# Altium footprint library Design III PCB Library.PcbLib: 98 footprints (part 2 of 7)
Each footprint in its own frame and in the unit in brackets; x right, y up, seen from the top. Pads: shape width x height; smd on the part's side, far side on the other; paste and mask are expansions set on the pad; w line width, h text height; cw(c..) or ccw(c..) is an arc to the next point about the centre after c.
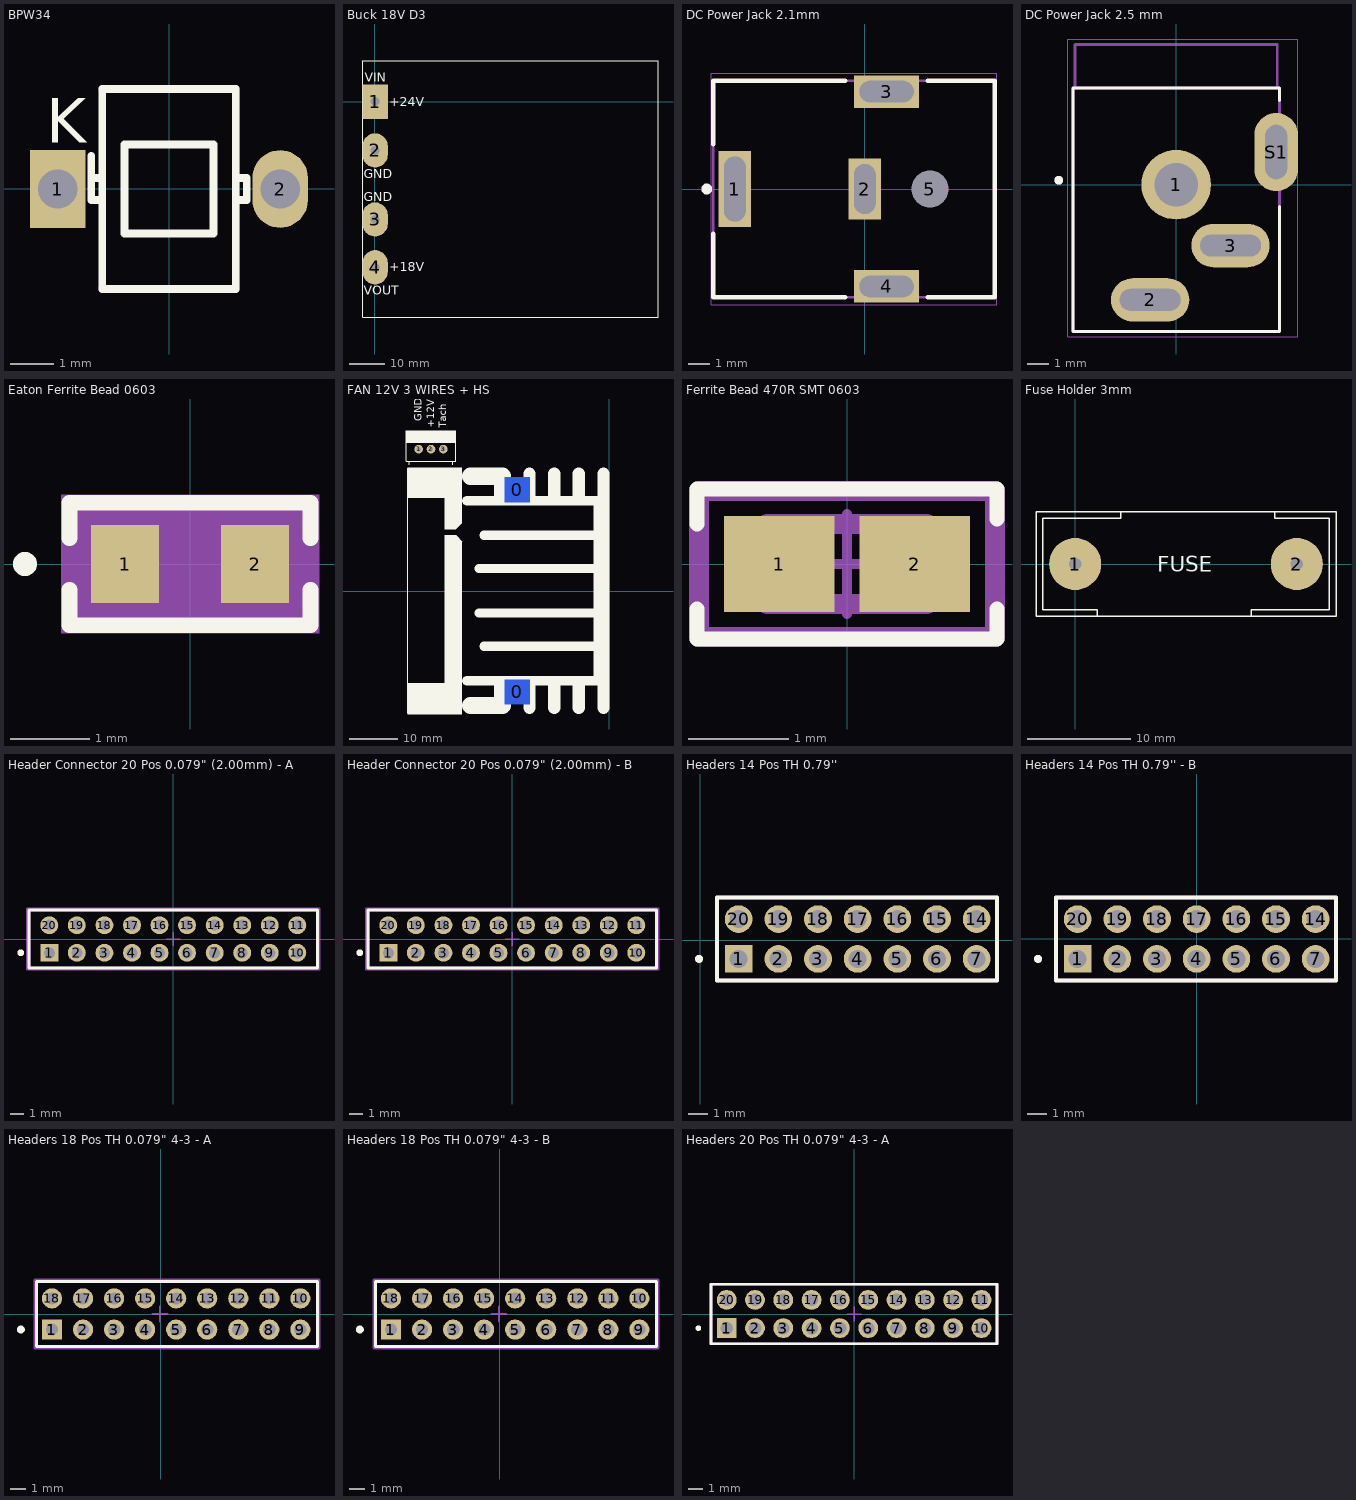
[diagram p1: the footprints below, top view; thin cyan lines are the x and y axes]

## BPW34 [mil] "Photodiode 850nm 20ns 120° 2-DIP (0.213\", 5.40mm)"
pads (2):
  rect 50x70 hole 35.4: 1(-100,-0.21)
  oval 50x70 hole 35.4: 2(100,-0.21)
Top Overlay:
  lines w7: -70,9.79 -60,9.79 ; -70,29.79 -70,-10.21 -60,-10.21 ; 60,-10.21 70,-10.21 70,9.79 60,9.79 ; -60,-90.21 -60,89.79 60,89.79 60,-90.21 -60,-90.21 ; -40,-40.21 -40,-0.21 -40,39.79 40,39.79 40,-40.21 -40,-40.21
  text "K" at -110.36,41.38 h40
Top Assembly:
  lines w7: -60,-90.21 60,-90.21 60,89.79 -60,89.79
3D body: height 70, standoff 10, extent -60,-90.21 60,89.79
3D body: height 77, standoff 75, extent -40,-40.21 40,39.79

## BPW34 - B [mm] "Photodiode 850nm 20ns 120° 2-DIP (0.213\", 5.40mm)"

## Buck 18V D3 [mil] "Buck 18V D3"
pads (4):
  rect 280x380 hole 100: 1(1.66,0.26)
  oval 280x380 hole 100: 2(1.66,-539.74) 3(1.66,-1304.74) 4(1.66,-1834.74)
Top Overlay:
  lines w5: -138.34,-2389.74 -138.34,455.26 3136.66,455.26 3136.66,-2389.74 -138.34,-2389.74
  text "GND" at -123.34,-849.74 h100
  text "GND" at -123.34,-1104.74 h100
  text "VOUT" at -123.34,-2139.74 h100
  text "+18V" at 156.66,-1879.74 h100
  text "+24V" at 156.66,-49.74 h100
  text "VIN" at -113.34,220.26 h100
3D body: height 191, standoff 190, extent -128.34,-1109.74 -53.34,-999.74
3D body: height 191, standoff 190, extent 71.66,-1109.74 146.66,-999.74
3D body: height 191, standoff 190, extent -28.34,-1109.74 46.66,-999.74
3D body: height 192, standoff 190, extent 346.66,-344.73 1191.66,-324.74
3D body: height 192, standoff 190, extent 346.66,-214.73 1191.66,-194.74
3D body: height 269, standoff 190, extent 351.66,-219.73 451.66,-209.73
3D body: height 269, standoff 190, extent 456.66,-219.73 556.66,-209.73
3D body: height 269, standoff 190, extent 561.66,-219.73 661.66,-209.73
3D body: height 269, standoff 190, extent 666.66,-219.73 766.66,-209.73
3D body: height 269, standoff 190, extent 771.66,-219.73 871.66,-209.73
3D body: height 269, standoff 190, extent 876.66,-219.73 976.66,-209.73
3D body: height 269, standoff 190, extent 981.66,-219.73 1081.66,-209.73
3D body: height 269, standoff 190, extent 1086.66,-219.74 1186.66,-209.74
3D body: height 520, standoff 190, extent 561.66,-759.74 686.66,-344.74
3D body: height 520, standoff 190, extent 561.66,-189.74 686.66,225.26
3D body: height 192, standoff 190, extent 836.77,35.29 1036.66,235.24
3D body: height 192, standoff 190, extent 836.77,-89.71 1036.66,110.24
3D body: height 192, standoff 190, extent 836.77,-214.71 1036.66,-14.77
3D body: height 192, standoff 190, extent 1111.77,-239.7 1311.66,-39.76
3D body: height 192, standoff 190, extent 1111.77,-489.71 1311.66,-289.76
3D body: height 192, standoff 190, extent 836.77,-774.71 1036.66,-574.77
3D body: height 192, standoff 190, extent 836.77,-649.71 1036.66,-449.76
3D body: height 192, standoff 190, extent 836.77,-524.71 1036.66,-324.76
3D body: height 192, standoff 190, extent 1256.71,-1404.72 1356.66,-1304.75
3D body: height 192, standoff 190, extent 1256.72,-1828.72 1356.66,-1728.75
3D body: height 200, standoff 190, extent 1186.65,-1429.74 1361.66,-1399.74
3D body: height 200, standoff 190, extent 1366.65,-1429.74 1541.66,-1399.74
3D body: height 200, standoff 190, extent 1186.65,-1749.74 1361.66,-1719.74
3D body: height 200, standoff 190, extent 1366.65,-1749.74 1541.66,-1719.74
3D body: height 200, standoff 190, extent 2601.65,-1039.74 2801.65,-1009.74
3D body: height 200, standoff 190, extent 2611.65,-539.74 2811.65,-509.74
3D body: height 225, standoff 190, extent 1626.65,-1109.74 1636.65,-1059.75
3D body: height 225, standoff 190, extent 1566.65,-1109.74 1576.65,-1059.75
3D body: height 225, standoff 190, extent 1576.65,-1109.74 1626.65,-1059.75
3D body: height 225, standoff 190, extent 1626.65,-1019.74 1636.65,-969.75
3D body: height 225, standoff 190, extent 1566.65,-1019.74 1576.65,-969.75
3D body: height 225, standoff 190, extent 1576.65,-1019.74 1626.65,-969.75
3D body: height 225, standoff 190, extent 1981.65,-1359.74 1991.65,-1309.75
3D body: height 225, standoff 190, extent 1921.65,-1359.74 1931.65,-1309.75
3D body: height 225, standoff 190, extent 1931.65,-1359.74 1981.65,-1309.75
3D body: height 225, standoff 190, extent 1981.65,-1294.74 1991.65,-1244.75
3D body: height 225, standoff 190, extent 1921.65,-1294.74 1931.65,-1244.75
3D body: height 225, standoff 190, extent 1931.65,-1294.74 1981.65,-1244.75
3D body: height 225, standoff 190, extent 1981.65,-1159.74 1991.65,-1109.75
3D body: height 225, standoff 190, extent 1921.65,-1159.74 1931.65,-1109.75
3D body: height 225, standoff 190, extent 1931.65,-1159.74 1981.65,-1109.75
3D body: height 225, standoff 190, extent 1701.65,-1194.74 1751.65,-1184.74
3D body: height 225, standoff 190, extent 1701.65,-1134.73 1751.65,-1124.73
3D body: height 225, standoff 190, extent 1701.65,-1184.74 1751.65,-1134.73
3D body: height 225, standoff 190, extent 1926.65,-814.74 1976.65,-804.74
3D body: height 225, standoff 190, extent 1926.65,-754.73 1976.65,-744.73
3D body: height 225, standoff 190, extent 1926.65,-804.74 1976.65,-754.73
3D body: height 225, standoff 190, extent 1751.66,-769.73 1761.66,-719.74
3D body: height 225, standoff 190, extent 1811.66,-769.73 1821.66,-719.74
3D body: height 225, standoff 190, extent 1761.66,-769.73 1811.66,-719.74
3D body: height 200, standoff 190, extent 1716.66,-844.74 1726.66,-814.73
3D body: height 200, standoff 190, extent 1736.66,-844.74 1746.66,-814.73
3D body: height 200, standoff 190, extent 1756.66,-844.74 1766.66,-814.73
3D body: height 200, standoff 190, extent 1776.66,-844.74 1786.66,-814.73
3D body: height 200, standoff 190, extent 1796.66,-844.74 1806.66,-814.73
3D body: height 200, standoff 190, extent 1816.66,-844.74 1826.66,-814.73
3D body: height 200, standoff 190, extent 1836.66,-844.74 1846.66,-814.73
3D body: height 200, standoff 190, extent 1856.66,-844.74 1866.66,-814.73
3D body: height 200, standoff 190, extent 1876.66,-844.74 1886.66,-814.73
3D body: height 200, standoff 190, extent 1896.66,-844.74 1906.66,-814.73
3D body: height 200, standoff 190, extent 1896.66,-1064.74 1906.66,-1034.73
3D body: height 200, standoff 190, extent 1876.66,-1064.74 1886.66,-1034.73
3D body: height 200, standoff 190, extent 1856.66,-1064.74 1866.66,-1034.73
3D body: height 200, standoff 190, extent 1836.66,-1064.74 1846.66,-1034.73
3D body: height 200, standoff 190, extent 1816.66,-1064.74 1826.66,-1034.73
3D body: height 200, standoff 190, extent 1796.66,-1064.74 1806.66,-1034.73
3D body: height 200, standoff 190, extent 1776.66,-1064.74 1786.66,-1034.73
3D body: height 200, standoff 190, extent 1756.66,-1064.74 1766.66,-1034.73
3D body: height 200, standoff 190, extent 1736.66,-1064.74 1746.66,-1034.73
3D body: height 200, standoff 190, extent 1716.66,-1064.74 1726.66,-1034.73
3D body: height 191, standoff 190, extent 1765.42,-647.24 1847.91,-572.24
3D body: height 191, standoff 190, extent 1765.42,-437.24 1847.91,-362.24
3D body: height 191, standoff 190, extent 1955.41,-272.24 2037.91,-197.24
3D body: height 191, standoff 190, extent 1955.41,-62.24 2037.91,12.76
3D body: height 191, standoff 190, extent 2235.41,-1412.24 2317.91,-1337.24
3D body: height 191, standoff 190, extent 2235.41,-1062.24 2317.91,-987.24
3D body: height 191, standoff 190, extent 2235.41,-1287.24 2317.91,-1212.24
3D body: height 191, standoff 190, extent 2235.41,-1187.24 2317.91,-1112.24
3D body: height 191, standoff 190, extent 2110.41,-1237.24 2192.91,-1162.24
3D body: height 191, standoff 190, extent 2010.41,-1237.24 2092.91,-1162.24
3D body: height 191, standoff 190, extent 1560.41,-937.24 1642.91,-862.24
3D body: height 191, standoff 190, extent 1560.41,-812.24 1642.91,-737.24
3D body "Led 3mm vert.STEP": height 340.51, standoff 214, extent 1007.59,-1429.59 1301.66,-1299.74
3D body "RESISTOR 0.25W 0.4.STEP": height 405.5, standoff 190, extent 1261.15,-1778.74 1352.16,-1354.74
3D body: height 352, standoff 350, extent 1866.75,-344.71 2016.66,-194.76
3D body: height 200, standoff 190, extent 1806.66,-414.74 1846.66,-384.74
3D body: height 200, standoff 190, extent 1806.66,-624.74 1846.66,-594.74
3D body: height 200, standoff 190, extent 1956.66,-249.74 1996.66,-219.74
3D body: height 200, standoff 190, extent 1956.66,-39.74 1996.66,-9.74
3D body: height 200, standoff 190, extent 2146.65,-604.74 2176.66,-404.74
3D body: height 200, standoff 190, extent 1626.65,-229.74 1656.66,-29.74
3D body: height 140, standoff 133, extent -3.34,-1889.74 86.66,-1799.74
3D body: height 135, standoff 65, extent -48.24,-1934.71 131.66,-1754.76
3D body: height 140, standoff 133, extent -43.34,-1349.74 46.66,-1259.74
3D body: height 135, standoff 65, extent -88.24,-1394.71 91.66,-1214.76
3D body: height 62, standoff 0, extent -98.34,-1404.74 101.66,-1204.74
3D body: height 220, standoff -180, extent -40.34,-1346.74 43.66,-1262.74
3D body: height 140, standoff 133, extent -3.34,-594.74 86.66,-504.74
3D body: height 135, standoff 65, extent -48.24,-639.71 131.66,-459.76
3D body: height 62, standoff 0, extent -98.34,-99.74 101.66,100.26
3D body: height 222, standoff -178, extent -40.34,-41.73 43.66,42.27
3D body: height 62, standoff 0, extent -98.34,-99.74 101.66,100.26
3D body: height 125, standoff 63, extent -98.34,-99.74 101.66,100.26
3D body: height 130, standoff 30, extent 2761.66,-2364.74 3111.66,-2014.74
3D body: height 130, standoff 30, extent 2761.66,85.26 3111.66,435.26
3D body: height 410, standoff 360, extent 1186.65,-164.74 1361.66,-114.74
3D body: height 360, standoff 190, extent 1186.66,-164.74 1236.66,-114.74
3D body: height 410, standoff 360, extent 211.66,-449.74 961.66,-399.74
3D body: height 410, standoff 360, extent 211.66,-699.74 961.66,-649.74
3D body: height 315, standoff 190, extent 261.66,-699.74 436.66,-399.74
3D body: height 245, standoff 190, extent 436.66,-699.74 561.66,-399.74
3D body: height 245, standoff 190, extent 436.66,-139.74 561.66,160.26
3D body: height 360, standoff 190, extent 911.66,110.26 961.66,160.26
3D body: height 410, standoff 360, extent 211.66,-139.74 961.66,-89.74
3D body: height 410, standoff 360, extent 211.66,110.26 961.66,160.26
3D body: height 410, standoff 360, extent 211.66,-14.74 961.66,35.26
3D body: height 315, standoff 175, extent 261.66,-139.74 436.66,160.26
3D body: height 525, standoff 520, extent 561.66,-764.74 686.66,-344.74
3D body: height 525, standoff 520, extent 561.66,-189.74 686.66,225.26
3D body: height 350, standoff 295, extent 1761.66,-464.74 2061.66,-64.74
3D body: height 475, standoff 295, extent 1361.66,-464.74 1761.66,-64.74
3D body: height 290, standoff 190, extent 1846.66,-654.74 2146.66,-354.74
3D body: height 290, standoff 190, extent 1656.66,-279.74 1956.66,20.26
3D body: height 215, standoff 190, extent 1711.66,-1039.74 1911.66,-839.74
3D body: height 310, standoff 190, extent 1186.66,-1719.74 1361.66,-1429.74
3D body: height 311, standoff 309, extent 1186.66,-1664.74 1361.66,-1634.74
3D body: height 310, standoff 190, extent 1366.66,-1719.74 1541.66,-1429.74
3D body: height 311, standoff 309, extent 1366.66,-1664.74 1541.66,-1634.74
3D body: height 509, standoff 504, extent 2518.87,-962.68 2894.66,-586.79
3D body: height 505, standoff 190, extent 2471.66,-1009.74 2941.66,-539.74
3D body: height 185, standoff 130, extent -138.34,-2389.74 3136.66,455.26
3D body: height 260, standoff 190, extent -88.23,-89.71 91.67,90.24
3D body: height 265, standoff 258, extent -43.34,-44.74 46.66,45.26
3D body: height 269, standoff 190, extent 1086.66,-329.74 1186.66,-319.74
3D body: height 269, standoff 190, extent 1086.66,-319.74 1186.66,-219.74
3D body: height 186, standoff 185, extent -138.34,-234.74 1541.66,235.26
3D body: height 186, standoff 185, extent -138.34,-774.74 1541.66,-304.74
3D body: height 186, standoff 185, extent -138.34,-1539.74 1541.66,-1069.74
3D body: height 186, standoff 185, extent -138.34,-2069.74 1541.66,-1599.74
3D body: height 186, standoff 185, extent 2346.66,-2164.74 3061.66,-809.74
3D body: height 186, standoff 185, extent 2346.66,-729.74 3061.66,-329.74
3D body: height 191, standoff 190, extent -118.34,215.26 -38.34,325.26
3D body: height 191, standoff 190, extent -18.34,215.26 26.66,325.26
3D body: height 191, standoff 190, extent 66.66,215.26 141.66,325.26
3D body: height 191, standoff 190, extent -128.34,-2144.74 -48.34,-2034.74
3D body: height 191, standoff 190, extent -28.34,-2144.74 46.66,-2034.74
3D body: height 191, standoff 190, extent 71.66,-2144.74 146.66,-2034.74
3D body: height 191, standoff 190, extent 171.66,-2144.74 246.66,-2034.74
3D body: height 191, standoff 190, extent -28.34,-854.74 46.66,-744.74
3D body: height 191, standoff 190, extent 71.66,-854.74 146.66,-744.74
3D body: height 191, standoff 190, extent -128.34,-854.74 -53.34,-744.74
3D body: height 410, standoff 360, extent 211.66,-574.74 961.66,-524.74
3D body: height 360, standoff 190, extent 911.66,-14.74 961.66,35.26
3D body: height 360, standoff 190, extent 911.66,-139.74 961.66,-89.74
3D body: height 360, standoff 190, extent 911.66,-449.74 961.66,-399.74
3D body: height 360, standoff 190, extent 911.66,-574.74 961.66,-524.74
3D body: height 360, standoff 190, extent 911.66,-699.74 961.66,-649.74
3D body: height 269, standoff 190, extent 981.66,-319.73 1081.66,-219.73
3D body: height 269, standoff 190, extent 981.66,-329.73 1081.66,-319.73
3D body: height 269, standoff 190, extent 876.66,-319.73 976.66,-219.73
3D body: height 269, standoff 190, extent 876.66,-329.73 976.66,-319.73
3D body: height 269, standoff 190, extent 771.66,-319.73 871.66,-219.73
3D body: height 269, standoff 190, extent 771.66,-329.73 871.66,-319.73
3D body: height 269, standoff 190, extent 666.66,-319.73 766.66,-219.73
3D body: height 269, standoff 190, extent 666.66,-329.73 766.66,-319.73
3D body: height 269, standoff 190, extent 561.66,-319.73 661.66,-219.73
3D body: height 269, standoff 190, extent 561.66,-329.73 661.66,-319.73
3D body: height 269, standoff 190, extent 456.66,-319.73 556.66,-219.73
3D body: height 269, standoff 190, extent 456.66,-329.73 556.66,-319.73
3D body: height 269, standoff 190, extent 351.66,-319.73 451.66,-219.73
3D body: height 269, standoff 190, extent 351.66,-329.73 451.66,-319.73
3D body: height 265, standoff 258, extent -44.15,-585.39 45.85,-495.39
3D body: height 260, standoff 190, extent -89.05,-630.36 90.85,-450.41
3D body: height 125, standoff 63, extent -99.16,-640.39 100.84,-440.39
3D body: height 62, standoff 0, extent -99.16,-640.39 100.84,-440.39
3D body: height 220, standoff -180, extent -41.15,-582.38 42.85,-498.38
3D body: height 62, standoff 0, extent -99.16,-640.39 100.84,-440.39
3D body: height 265, standoff 258, extent -43.34,-1349.74 46.66,-1259.74
3D body: height 260, standoff 190, extent -88.24,-1394.71 91.66,-1214.76
3D body: height 125, standoff 63, extent -98.34,-1404.74 101.66,-1204.74
3D body: height 62, standoff 0, extent -98.34,-1404.74 101.66,-1204.74
3D body: height 220, standoff -180, extent -40.34,-1346.74 43.66,-1262.74
3D body: height 62, standoff 0, extent -98.34,-1404.74 101.66,-1204.74
3D body: height 265, standoff 258, extent -43.34,-1879.74 46.66,-1789.74
3D body: height 260, standoff 190, extent -88.24,-1924.71 91.66,-1744.76
3D body: height 125, standoff 63, extent -98.34,-1934.74 101.66,-1734.74
3D body: height 62, standoff 0, extent -98.34,-1934.74 101.66,-1734.74
3D body: height 220, standoff -180, extent -40.34,-1876.73 43.66,-1792.73
3D body: height 62, standoff 0, extent -98.34,-1934.74 101.66,-1734.74
3D body: height 360, standoff 190, extent 1186.66,-414.74 1236.66,-364.74
3D body: height 410, standoff 360, extent 1186.65,-414.74 1361.66,-364.74

## DC Power Jack 2.1mm [mm] "PJ-063AH"
pads (5):
  rect 1.5x3.5 hole 1 slot 3 at 90 deg: 1(-6,0)
  rect 1.5x2.8 hole 1 slot 2.3 at 90 deg: 2(0,0)
  rect 3x1.5 hole 1 slot 2.5 at 0 deg: 3(1,4.5) 4(1,-4.5)
  round 1.4 hole 1.7 unplated: 5(3,0)
Top Overlay:
  circle w0.25: c-7.3,0 r0.125
  lines w0.2: -7,-2.062 -7,-5 -0.9,-5 ; -7,2.062 -7,5 -0.9,5 ; 2.9,-5 6,-5 6,5 2.9,5
Mechanical 13:
  lines w0.1: -7,-5 -7,5 6,5 6,-5 -7,-5
Mechanical 15:
  lines w0.05: -7.1,-5.35 -7.1,5.35 6.1,5.35 6.1,-5.35 -7.1,-5.35
  lines w0.1: -0.5,0 0.5,0 ; 0,-0.5 0,0.5
3D body "pj-063ah.stp": height 9, standoff -3, extent -7,-5.15 6,5.15

## DC Power Jack 2.5 mm [mm] "Power Barrel Connector Jack 2.50mm ID (0.098\"), 5.50mm OD (0.217\") Through Hole"
pads (4):
  round 3.2 hole 2: 1(0,0)
  oval 3.6x2 hole 1 slot 2.8 at 0 deg: 2(-1.2,-5.3) 3(2.5,-2.8)
  oval 2x3.6 hole 1 slot 2.5 at 90 deg: S1(4.6,1.5)
Top Overlay:
  circle w0.2: c-5.4,0.2 r0.1
  lines w0.127: 4.75,-1 4.75,-6.75 -4.75,-6.75 -4.75,4.45 4.75,4.45 4.75,3.875
Mechanical 13:
  circle w0.2: c-5.4,0.2 r0.1
  lines w0.127: -4.65,4.45 -4.65,6.45 4.65,6.45 4.65,4.45 ; -4.75,-6.75 4.75,-6.75 4.75,4.45 -4.75,4.45 -4.75,-6.75
Mechanical 15:
  lines w0.05: -5,-7 5.6,-7 5.6,6.7 -5,6.7 -5,-7
3D body "CUI_DEVICES_PJ-090BH-2.step": height 14.2, standoff -1.8, extent -4.7,-6.7 4.8,4.5

## Eaton Ferrite Bead 0603 [mil] "Power Line Ferrite Bead 0603 (1608 Metric)"
pads (2):
  rect 33.78x39 smd paste+0 mask+0: 1(-32.39,0) 2(32.39,0)
Top Overlay:
  circle w6: c-82.28,0 r3
  lines w7.87: -60.04,-12.8 -60.04,-30.51 60.04,-30.51 60.04,-12.8 ; -60.04,12.8 -60.04,30.51 60.04,30.51 60.04,12.8
Mechanical 5:
  region: 64.28,-34.5 -64.28,-34.5 -64.28,34.5 64.28,34.5
Mechanical 13:
  circle w0: c-27.39,0 r3
  lines w1: -35.5,-19.5 -35.5,19.5 ; -35.5,-19.5 -15.5,-19.5 -15.5,19.5 -35.5,19.5 ; -35.5,-19.5 35.5,-19.5 ; -35.5,-19.5 -35.5,19.5 ; -35.5,19.5 35.5,19.5 ; 35.5,-19.5 15.5,-19.5 15.5,19.5 35.5,19.5 ; 35.5,-19.5 35.5,19.5 ; 35.5,-19.5 35.5,19.5
Mechanical 15:
  region: 59.28,-29.5 -59.28,-29.5 -59.28,29.5 59.28,29.5
  lines w6: -59.28,-29.5 -59.28,29.5 59.28,29.5 59.28,-29.5 -59.28,-29.5
3D body "IND_MFBM1V1608_EAT.step": height 39.02, standoff 0, extent -35.51,-19.49 35.51,19.49

## FAN 12V 3 WIRES + HS [mil]
pads (5):
  rect 200x200 smd far side: 0(-745.94,-818.28) 0(-745.94,821.72)
  round 70 hole 35.4: 1(-1545.94,1151.72) 2(-1445.94,1151.72) 3(-1345.94,1151.72)
Top Overlay:
  rectangle: -125.94,-748.28 4.06,751.72
  rectangle: -1645.94,1201.72 -1245.94,1301.72
  region: -1245.94,451.72 -1195.94,401.72 -1195.94,-998.28 -1635.94,-998.28 -1635.94,-748.28 -1335.94,-748.28 -1335.94,451.72
  region: -1195.94,1001.72 -1195.94,551.72 -1245.94,501.72 -1335.94,501.72 -1335.94,756.72 -1630.94,756.72 -1630.94,996.72 -1635.94,1001.72
  lines w10: -1635.94,-993.28 -1635.94,996.72 ; -1620.94,1026.72 -1620.94,1051.72 ; -1335.94,451.72 -1245.94,451.72 -1195.94,401.72 ; -1270.94,1026.72 -1270.94,1051.72 ; -1645.94,1051.72 -1245.94,1051.72 -1245.94,1301.72 -1645.94,1301.72 -1645.94,1051.72
  lines w75: -1155.94,-728.28 -95.94,-728.28 ; -1155.94,731.72 -95.94,731.72 ; -1055.94,-178.28 -95.94,-178.28 ; -1055.94,181.72 -95.94,181.72 ; -1015.94,-448.28 -95.94,-448.28 ; -1015.94,451.72 -95.94,451.72
  lines w100: -645.94,-948.28 -645.94,-748.28 ; -645.94,751.72 -645.94,951.72 ; -445.94,-948.28 -445.94,-748.28 ; -445.94,751.72 -445.94,951.72 ; -245.94,-948.28 -245.94,-748.28 ; -245.94,751.72 -245.94,951.72 ; -45.94,-948.28 -45.94,951.72
  lines w140: -1125.94,-928.28 -865.94,-928.28 -865.94,-768.28 ; -1125.94,931.72 -865.94,931.72 -865.94,771.72
  text "Tach" at -1320.94,1326.72 h60
  text "+12V" at -1420.94,1326.72 h60
  text "GND" at -1520.94,1376.72 h60

## Ferrite Bead 470R SMT 0603 [mm] "470 Ohms @ 100 MHz 1 Power Line Ferrite Bead 0603 (1608 Metric) 1A 200mOhm"
pads (2):
  rect 1.106x0.958 smd paste+0 mask+0: 1(-0.676,0) 2(0.676,0)
Top Overlay:
  lines w0.15: -1.5,-0.45 -1.5,-0.75 1.5,-0.75 1.5,-0.45 ; -1.5,0.401 -1.5,0.75 1.5,0.75 1.5,0.45
Top Assembly:
  lines w0.2: -1.479,-0.729 1.479,-0.729 1.479,0.729 -1.479,0.729 -1.479,-0.729
Top Courtyard:
  lines w0.2: -1.479,-0.729 1.479,-0.729 1.479,0.729 -1.479,0.729 -1.479,-0.729
Board:
  lines w0.2: -0.8,-0.4 0.8,-0.4 0.8,0.4 -0.8,0.4 -0.8,-0.4
Top Component Center:
  lines w0.1: -0.5,0 0.5,0 ; 0,-0.5 0,0.5
3D body "FBead_Murata_BLM18EG221SN1D_eec.STEP": height 0.25, standoff 0, extent -1.479,-0.729 1.479,0.729

## Fuse Holder 3mm [mm] "Fuse Holder 3mm"
pads (2):
  round 5.08 hole 1.199: 1(-0.029,0) 2(21.561,0)
Top Overlay:
  lines w0.127: 2.13,-5.08 2.13,-4.445 -3.204,-4.445 -3.204,4.445 4.416,4.445 4.416,5.08 ; 17.116,-5.08 17.116,-4.445 24.736,-4.445 24.736,4.445 19.402,4.445 19.402,5.08 ; -3.839,-5.08 25.371,-5.08 25.371,5.08 -3.839,5.08 -3.839,-5.08
  text "FUSE" at 7.972,-0.762 h1.52
3D body: height 2.92, standoff 0.13, extent -3.839,-5.08 25.371,5.08
3D body: height 10.16, standoff 2.92, extent -3.839,-5.08 4.416,5.08
3D body: height 10.16, standoff 2.92, extent 17.116,-5.08 25.371,5.08
3D body: height 0.13, standoff -4.95, extent -0.611,-0.583 0.555,0.584
3D body: height 0.13, standoff -4.95, extent 20.979,-0.583 22.145,0.584
3D body: height 9.53, standoff 2.92, extent 0.479,-4.318 1.241,-3.175
3D body: height 9.53, standoff 2.92, extent 0.479,3.175 1.241,4.318
3D body: height 2.95, standoff 2.92, extent -3.204,-4.318 1.241,4.318
3D body: height 2.95, standoff 2.92, extent 20.291,-4.318 24.736,4.318
3D body: height 9.53, standoff 2.92, extent 20.291,3.175 21.053,4.318
3D body: height 9.53, standoff 2.92, extent 20.291,-4.318 21.053,-3.175
3D body: height 4.44, standoff 2.92, extent 19.402,-3.175 20.037,3.175
3D body: height 4.44, standoff 2.92, extent 1.495,-3.175 2.13,3.175
3D body: height 3, standoff 2.92, extent 3.147,3.048 4.416,4.318
3D body: height 3, standoff 2.92, extent 3.147,-4.318 4.416,-3.048
3D body: height 3, standoff 2.92, extent 17.117,-4.318 18.386,-3.048
3D body: height 3, standoff 2.92, extent 17.117,3.048 18.386,4.318

## Header Connector 20 Pos 0.079" (2.00mm) - A [mm] "20 Position Header Connector 0.079\" (2.00mm) Through Hole Gold"
pads (20):
  rect 1.3x1.3 hole 0.8 paste-1000 mask+0: 1(-9,-1)
  round 1.3 hole 0.8 paste-1000 mask+0: 2(-7,-1) 3(-5,-1) 4(-3,-1) 5(-1,-1) 6(1,-1) 7(3,-1) 8(5,-1) 9(7,-1) 10(9,-1) 11(9,1) 12(7,1) 13(5,1) 14(3,1) 15(1,1) 16(-1,1) 17(-3,1) 18(-5,1) 19(-7,1) 20(-9,1)
Top Overlay:
  circle w0.25: c-11.075,-1 r0.125
  lines w0.2: -10.475,-2.1 10.475,-2.1 10.475,2.1 -10.475,2.1 -10.475,-2.1
Top Assembly:
  lines w0.2: -10.575,-2.2 -10.575,2.2 10.575,2.2 10.575,-2.2 -10.575,-2.2
Top Courtyard:
  lines w0.2: -10.575,-2.2 -10.575,2.2 10.575,2.2 10.575,-2.2 -10.575,-2.2
Board:
  lines w0.2: -10.475,-2.1 -10.475,2.1 10.475,2.1 10.475,-2.1 -10.475,-2.1
Top Component Center:
  lines w0.1: -0.5,0 0.5,0 ; 0,-0.5 0,0.5
3D body "Conn_Sullins_NPPN102AFCN-RC_eec.STEP": height 0.25, standoff 0, extent -10.575,-2.2 10.575,2.2

## Header Connector 20 Pos 0.079" (2.00mm) - B [mm]
pads (20):
  rect 1.3x1.3 hole 0.8 paste-1000 mask+0: 1(-9,-1)
  round 1.3 hole 0.8 paste-1000 mask+0: 2(-7,-1) 3(-5,-1) 4(-3,-1) 5(-1,-1) 6(1,-1) 7(3,-1) 8(5,-1) 9(7,-1) 10(9,-1) 11(9,1) 12(7,1) 13(5,1) 14(3,1) 15(1,1) 16(-1,1) 17(-3,1) 18(-5,1) 19(-7,1) 20(-9,1)
Top Overlay:
  circle w0.25: c-11.075,-1 r0.125
  lines w0.2: -10.475,-2.1 10.475,-2.1 10.475,2.1 -10.475,2.1 -10.475,-2.1
Top Assembly:
  lines w0.2: -10.575,-2.2 -10.575,2.2 10.575,2.2 10.575,-2.2 -10.575,-2.2
Top Courtyard:
  lines w0.2: -10.575,-2.2 -10.575,2.2 10.575,2.2 10.575,-2.2 -10.575,-2.2
Board:
  lines w0.2: -10.475,-2.1 -10.475,2.1 10.475,2.1 10.475,-2.1 -10.475,-2.1
Top Component Center:
  lines w0.1: -0.5,0 0.5,0 ; 0,-0.5 0,0.5

## Headers 14 Pos TH 0.79'' [mm]
pads (14):
  rect 1.4x1.4 hole 0.9: 1(1.925,-0.925)
  round 1.4 hole 0.9: 2(3.925,-0.925) 3(5.925,-0.925) 4(7.925,-0.925) 5(9.925,-0.925) 6(11.925,-0.925) 7(13.925,-0.925) 14(13.925,1.075) 15(11.925,1.075) 16(9.925,1.075) 17(7.925,1.075) 18(5.925,1.075) 19(3.925,1.075) 20(1.925,1.075)
Top Overlay:
  circle w0.2: c-0.075,-0.925 r0.1
  lines w0.2: 0.825,-2.025 0.825,2.175 14.95,2.175 14.95,-2.025 0.825,-2.025
Top Courtyard:
  lines w0.2: 0.825,-2.025 14.95,-2.025 14.95,2.175 0.825,2.175 0.825,-2.025
3D body "BF050-14-A-B-0200-0300-L-G.STEP": height 4, standoff -3, extent 0.925,-1.925 14.925,2.075

## Headers 14 Pos TH 0.79'' - B [mm]
pads (14):
  rect 1.4x1.4 hole 0.9: 1(-6,-1.025)
  round 1.4 hole 0.9: 2(-4,-1.025) 3(-2,-1.025) 4(0,-1.025) 5(2,-1.025) 6(4,-1.025) 7(6,-1.025) 14(6,0.975) 15(4,0.975) 16(2,0.975) 17(0,0.975) 18(-2,0.975) 19(-4,0.975) 20(-6,0.975)
Top Overlay:
  circle w0.2: c-8,-1.025 r0.1
  lines w0.2: -7.1,-2.125 7.025,-2.125 7.025,2.075 -7.1,2.075 -7.1,-2.125
Top Courtyard:
  lines w0.2: -7.1,-2.125 -7.1,2.075 7.025,2.075 7.025,-2.125 -7.1,-2.125

## Headers 18 Pos TH 0.079" 4-3 - A [mm] "Connector Header Through Hole 18 position 0.079\" (2.00mm)"
pads (18):
  rect 1.3x1.3 hole 0.8 paste-1000 mask+0: 1(-7,-1)
  round 1.3 hole 0.8 paste-1000 mask+0: 2(-5,-1) 3(-3,-1) 4(-1,-1) 5(1,-1) 6(3,-1) 7(5,-1) 8(7,-1) 9(9,-1) 10(9,1) 11(7,1) 12(5,1) 13(3,1) 14(1,1) 15(-1,1) 16(-3,1) 17(-5,1) 18(-7,1)
Top Overlay:
  circle w0.25: c-9,-1 r0.125
  lines w0.2: -8,-2.1 -8,2.1 10.1,2.1 10.1,-2.1 -8,-2.1
Top Assembly:
  lines w0.2: -8,-2.1 -8,2.1 10.1,2.1 10.1,-2.1 -8,-2.1
Top Courtyard:
  lines w0.2: -8.1,-2.2 10.2,-2.2 10.2,2.2 -8.1,2.2 -8.1,-2.2
Board:
  lines w0.2: -8,-2.1 10.1,-2.1 10.1,2.1 -8,2.1 -8,-2.1
Top Component Center:
  lines w0.1: -0.55,0 0.45,0 ; -0.05,-0.5 -0.05,0.5
3D body "BF050-18-A-B-0400-0300-L-G.stp": height 6, standoff -3, extent -8,-2 10,2

## Headers 18 Pos TH 0.079" 4-3 - B [mm] "Connector Header Through Hole 18 position 0.079\" (2.00mm)"
pads (18):
  rect 1.3x1.3 hole 0.8 paste-1000 mask+0: 1(-7,-1)
  round 1.3 hole 0.8 paste-1000 mask+0: 2(-5,-1) 3(-3,-1) 4(-1,-1) 5(1,-1) 6(3,-1) 7(5,-1) 8(7,-1) 9(9,-1) 10(9,1) 11(7,1) 12(5,1) 13(3,1) 14(1,1) 15(-1,1) 16(-3,1) 17(-5,1) 18(-7,1)
Top Overlay:
  circle w0.25: c-9,-1 r0.125
  lines w0.2: -8,-2.1 -8,2.1 10.1,2.1 10.1,-2.1 -8,-2.1
Top Assembly:
  lines w0.2: -8,-2.1 -8,2.1 10.1,2.1 10.1,-2.1 -8,-2.1
Top Courtyard:
  lines w0.2: -8.1,-2.2 10.2,-2.2 10.2,2.2 -8.1,2.2 -8.1,-2.2
Board:
  lines w0.2: -8,-2.1 10.1,-2.1 10.1,2.1 -8,2.1 -8,-2.1
Top Component Center:
  lines w0.1: -0.55,0 0.45,0 ; -0.05,-0.5 -0.05,0.5

## Headers 20 Pos TH 0.079" 4-3 - A [mm] "Connector Header Through Hole 20 position 0.079\" (2.00mm)"
pads (20):
  rect 1.4x1.4 hole 0.9: 1(-9,-1)
  round 1.4 hole 0.9: 2(-7,-1) 3(-5,-1) 4(-3,-1) 5(-1,-1) 6(1,-1) 7(3,-1) 8(5,-1) 9(7,-1) 10(9,-1) 11(9,1) 12(7,1) 13(5,1) 14(3,1) 15(1,1) 16(-1,1) 17(-3,1) 18(-5,1) 19(-7,1) 20(-9,1)
Top Overlay:
  circle w0.2: c-11,-1 r0.1
  lines w0.2: -10.1,-2.1 10.1,-2.1 10.1,2.1 -10.1,2.1 -10.1,-2.1
Top Courtyard:
  lines w0.2: -10.1,-2.1 -10.1,2.1 10.1,2.1 10.1,-2.1 -10.1,-2.1
Top Component Center:
  lines w0.1: -0.5,0 0.5,0 ; 0,-0.5 0,0.5
3D body "BF050-20-A-B-0400-0300-L-G.stp": height 6, standoff -3, extent -10,-2 10,2